# Altium footprint library PcbLib1.PcbLib: 150 footprints (part 1 of 10)
Each footprint in its own frame and in the unit in brackets; x right, y up, seen from the top. Pads: shape width x height; smd on the part's side, far side on the other; paste and mask are expansions set on the pad; w line width, h text height; cw(c..) or ccw(c..) is an arc to the next point about the centre after c.
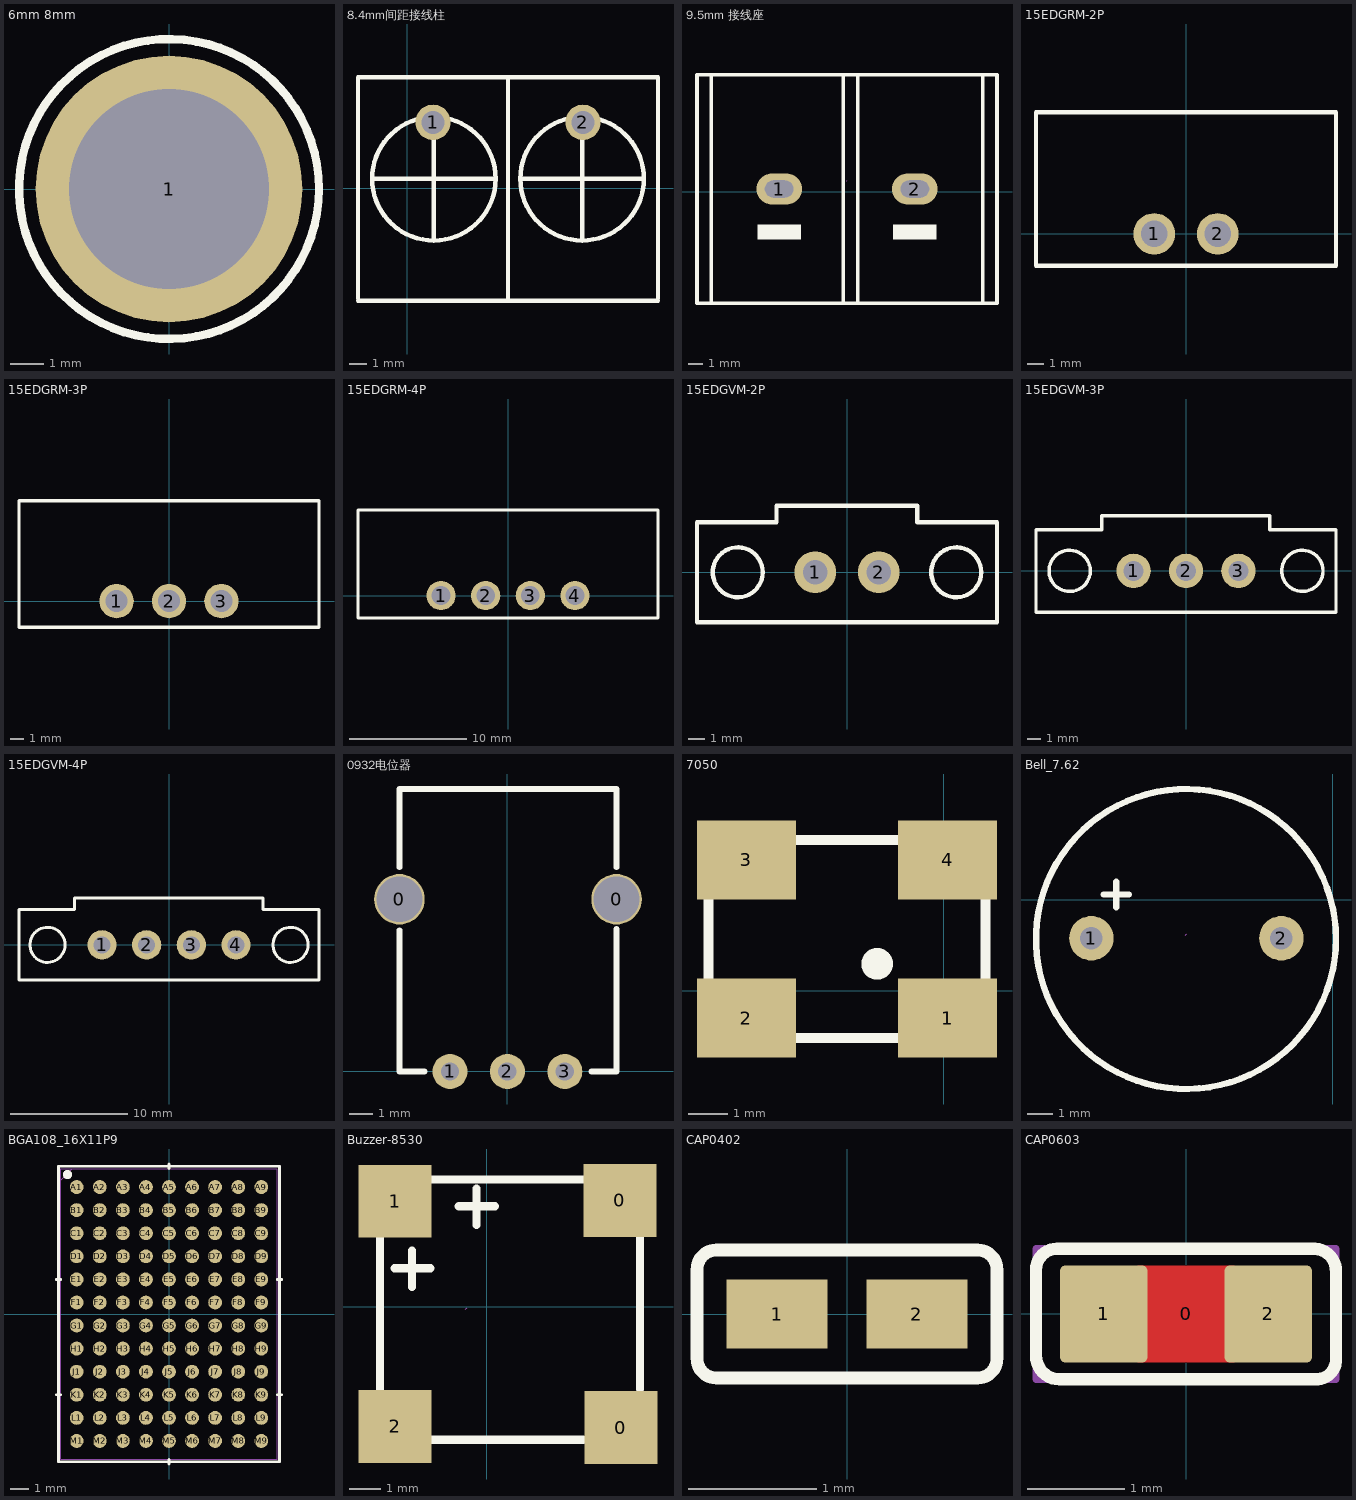
[diagram p0: the footprints below, top view; thin cyan lines are the x and y axes]

## 6mm 8mm [mm]
pads (1):
  round 8 hole 6: 1(0,0)
Top Overlay:
  circle w0.254: c0,0 r4.5

## 8.4mm间距接线柱 [mm]
pads (2):
  round 2 hole 1.3: 1(1.456,3.725) 2(9.956,3.725)
Top Overlay:
  circle w0.254: c1.506,0.525 r3.5
  circle w0.254: c9.904,0.525 r3.5
  lines w0.254: -2.794,-6.375 14.206,-6.375 ; -2.794,-6.275 -2.794,6.225 ; -2.794,6.265 14.206,6.265 ; -1.994,0.525 5.006,0.525 ; 1.506,-2.975 1.506,3.925 ; 5.706,-6.275 5.706,6.225 ; 6.404,0.526 13.404,0.526 ; 9.904,-2.974 9.904,3.926 ; 14.206,-6.275 14.206,6.225
Mechanical 15:
  lines w0.003: 5.681,0.522 5.731,0.573

## 9.5mm 接线座 [mm]
pads (2):
  oval 3.2x2.2 hole 1.2 slot 2 at 0 deg: 1(8.443,0.177) 2(17.942,0.177)
Top Overlay:
  region: 6.942,-2.323 9.942,-2.323 9.942,-3.323 6.942,-3.323
  region: 16.442,-2.323 19.442,-2.323 19.442,-3.323 16.442,-3.323
  lines w0.254: 3.693,-7.823 3.693,8.177 ; 12.943,-7.823 12.943,8.177 ; 13.943,-7.823 13.943,8.177 ; 22.692,-7.823 22.692,8.177 ; 23.692,-7.823 2.692,-7.823 2.693,8.177 23.692,8.177 ; 23.692,-7.823 23.692,8.177
Mechanical 15:
  lines w0.003: 13.167,0.734 13.218,0.785

## 15EDGRM-2P [mm]
pads (2):
  round 2.5 hole 1.6: 1(-1.905,0) 2(1.905,0)
Top Overlay:
  lines w0.254: -9,-1.905 -9,7.295 9,7.295 9,-1.905 -9,-1.905
3D body "2-4零件.STEP": height 7.9, standoff -2.6, extent -9,-1.143 9,8.057

## 15EDGRM-3P [mm]
pads (3):
  round 2.5 hole 1.6: 1(-3.81,0) 2(0,0) 3(3.81,0)
Top Overlay:
  lines w0.254: -10.905,-1.905 -10.905,7.295 10.905,7.295 10.905,-1.905 -10.905,-1.905
3D body "3-1零件.STEP": height 7.9, standoff -2.6, extent -10.725,-1.143 10.775,8.057

## 15EDGRM-4P [mm]
pads (4):
  round 2.5 hole 1.6: 1(-5.715,0) 2(-1.905,0) 3(1.905,0) 4(5.715,0)
Top Overlay:
  lines w0.254: -12.81,-1.905 12.81,-1.905 12.81,7.295 -12.81,7.295 -12.81,-1.905
3D body "4-2零件.STEP": height 7.9, standoff -2.6, extent -12.139,-1.27 12.241,7.93

## 15EDGVM-2P [mm]
pads (2):
  round 2.5 hole 1.45: 1(-1.905,0) 2(1.905,0)
Top Overlay:
  circle w0.254: c-6.555,0 r1.5
  circle w0.254: c6.555,0 r1.5
  lines w0.254: -9,-3 9,-3 9,3 ; -9,-2.997 -9,3 -4.235,3 ; -4.242,3 -4.235,3 ; 4.216,3 4.216,3.998 -4.235,3.998 -4.235,3 ; 4.235,3 8.985,3
3D body "2-1零件.STEP": height 21.64, standoff 2.54, extent -9.025,-4.623 8.975,4.877
3D body "2-2零件.STEP": height 9.2, standoff -3.5, extent -8.992,-2.885 9.008,4.115

## 15EDGVM-3P [mm]
pads (3):
  round 2.5 hole 1.45: 1(-3.81,0) 2(0,0) 3(3.81,0)
Top Overlay:
  circle w0.254: c-8.46,0 r1.5
  circle w0.254: c8.46,0 r1.5
  lines w0.254: 6.096,3 6.096,3.998 -6.121,3.998 -6.121,3 -10.905,3 -10.905,-3 10.905,-3 10.905,3 ; 6.121,2.997 10.871,2.997
3D body "3-3零件.STEP": height 21.64, standoff 2.54, extent -10.699,-4.953 10.801,4.547
3D body "3-2零件.STEP": height 9.2, standoff -3.5, extent -10.693,-3.063 10.807,3.937

## 15EDGVM-4P [mm]
pads (4):
  round 2.5 hole 1.45: 1(-5.715,0) 2(-1.905,0) 3(1.905,0) 4(5.715,0)
Top Overlay:
  circle w0.254: c10.365,0 r1.5
  circle w0.254: c-10.365,0 r1.5
  lines w0.254: -8.052,3 -8.045,3 ; 8.026,3 8.026,3.998 -8.045,3.998 -8.045,3 ; 8.045,3 12.795,3 12.795,-3 -12.795,-3 -12.795,3 -8.045,3
3D body "4-1零件.STEP": height 9.2, standoff -3.5, extent -12.063,-3.038 12.317,3.962
3D body "4-3零件.STEP": height 21.64, standoff 2.54, extent -12.086,-4.877 12.294,4.623

## 0932电位器 [mm]
pads (5):
  round 2.2 hole 2: 0(-4.7,7.5) 0(4.75,7.5)
  round 1.524 hole 0.8: 1(-2.5,0) 2(0,0) 3(2.5,0)
Top Overlay:
  lines w0.254: -4.7,6.147 -4.7,0 -3.607,0 ; -4.7,8.89 -4.7,12.3 4.75,12.3 4.75,8.89 ; 3.657,0 4.749,0 4.749,6.198

## 7050 [mm]
pads (4):
  rect 2.5x2 smd: 1(0.102,-0.686) 2(-4.978,-0.686) 3(-4.978,3.312) 4(0.102,3.312)
Top Overlay:
  lines w0.254: -5.938,-1.187 -5.938,3.813 1.062,3.813 1.062,-1.187 -5.938,-1.187
  lines w0.4: -1.678,0.886 ccw(c-1.676,0.686) -1.675,0.886

## Bell_7.62 [mil]
pads (2):
  round 70 hole 35.4: 1(-379.9,-60.6) 2(-80.7,-60.6)
Top Overlay:
  circle w10: c-230.8,-61.8 r236.2
  lines w10: -360.8,8.2 -320.8,8.2 ; -340.8,-11.8 -340.8,28.2
Mechanical 15:
  lines w0.1: -231.8,-55.85 -229.8,-53.85

## BGA108_16X11P9 [mil]
pads (108):
  round 30 smd paste+0 mask+0: A1(-200,275) A2(-150,275) A3(-100,275) A4(-50,275) A5(0,275) A6(50,275) A7(100,275) A8(150,275) A9(200,275) B1(-200,225) B2(-150,225) B3(-100,225) B4(-50,225) B5(0,225) B6(50,225) B7(100,225) B8(150,225) B9(200,225) C1(-200,175) C2(-150,175) C3(-100,175) C4(-50,175) C5(0,175) C6(50,175) C7(100,175) C8(150,175) C9(200,175) D1(-200,125) D2(-150,125) D3(-100,125) D4(-50,125) D5(0,125) D6(50,125) D7(100,125) D8(150,125) D9(200,125) E1(-200,75) E2(-150,75) E3(-100,75) E4(-50,75) E5(0,75) E6(50,75) E7(100,75) E8(150,75) E9(200,75) F1(-200,25) F2(-150,25) F3(-100,25) F4(-50,25) F5(0,25) F6(50,25) F7(100,25) F8(150,25) F9(200,25) G1(-200,-25) G2(-150,-25) G3(-100,-25) G4(-50,-25) G5(0,-25) G6(50,-25) G7(100,-25) G8(150,-25) G9(200,-25) H1(-200,-75) H2(-150,-75) H3(-100,-75) H4(-50,-75) H5(0,-75) H6(50,-75) H7(100,-75) H8(150,-75) H9(200,-75) J1(-200,-125) J2(-150,-125) J3(-100,-125) J4(-50,-125) J5(0,-125) J6(50,-125) J7(100,-125) J8(150,-125) J9(200,-125) K1(-200,-175) K2(-150,-175) K3(-100,-175) K4(-50,-175) K5(0,-175) K6(50,-175) K7(100,-175) K8(150,-175) K9(200,-175) L1(-200,-225) L2(-150,-225) L3(-100,-225) L4(-50,-225) L5(0,-225) L6(50,-225) L7(100,-225) L8(150,-225) L9(200,-225) M1(-200,-275) M2(-150,-275) M3(-100,-275) M4(-50,-275) M5(0,-275) M6(50,-275) M7(100,-275) M8(150,-275) M9(200,-275)
Top Overlay:
  circle w10: c-220,302 r5
  lines w6: -244.5,-175 -234.5,-175 ; -244.5,75 -234.5,75 ; 0,-325 0,-315 ; 0,315 0,325 ; 234.5,-175 244.5,-175 ; 234.5,75 244.5,75 ; -239.5,-320 -239.5,320 239.5,320 239.5,-320 -239.5,-320
Mechanical 13:
  lines w1: -234.5,290 -209.5,315 ; -234.5,-315 -234.5,315 234.5,315 234.5,-315 -234.5,-315
3D body "BGA108_16X11P9.step": height 146.1, standoff 0, extent -234.49,-315 234.49,315
3D body: height 10, standoff 0, extent 0,0 10,10

## Buzzer-8530 [mm]
pads (4):
  rect 2.3x2.3 smd: 0(4.194,3.358) 0(4.224,-3.803) 1(-2.895,3.332) 2(-2.897,-3.77)
Top Overlay:
  lines w0.254: -3.376,-2.588 -3.376,2.212 ; -2.921,1.219 -1.778,1.219 ; -2.362,0.635 -2.362,1.778 ; -1.776,-4.188 3.024,-4.188 ; -1.776,4.012 3.024,4.012 ; -0.889,3.175 0.254,3.175 ; -0.33,2.591 -0.33,3.734 ; 4.824,-2.588 4.824,2.212
Mechanical 15:
  lines w0.003: -0.678,-0.072 -0.628,-0.021
3D body "User Library-MLT-8530.STEP": height 3, standoff 0, extent -3.539,-4.351 4.961,4.149

## CAP0402 [mm]
pads (2):
  rect 0.79x0.54 smd: 1(-0.545,0) 2(0.545,0)
Top Overlay:
  lines w0.1: -1.169,-0.346 ccw(c-1.016,-0.346) -1.016,-0.499 -0.226,-0.499 0.226,-0.499 1.016,-0.499 ccw(c1.016,-0.346) 1.169,-0.346 1.169,0.346 ccw(c1.016,0.346) 1.016,0.499 0.226,0.499 -0.226,0.499 -1.016,0.499 ccw(c-1.016,0.346) -1.169,0.346 -1.169,-0.346
Mechanical 5:
  region: 0.5,-0.25 0.5,0.25 0.25,0.25 0.25,-0.25
3D body "0402_AVX.step": height 0.56, standoff 0, extent -0.559,-0.305 0.559,0.305

## CAP0603 [mm]
pads (3):
  round 0.254 on Mech14: 0(0,0)
  rrect10% 0.9x1 smd: 1(-0.85,0) 2(0.85,0)
Top Layer:
  pour cut-out: -0.5,0.5 0.5,0.5 0.5,-0.5 -0.5,-0.5
Top Overlay:
  lines w0.127: -1.55,-0.432 ccw(c-1.307,-0.432) -1.307,-0.675 -0.45,-0.675 0.45,-0.675 1.361,-0.675 ccw(c1.346,-0.472) 1.549,-0.457 1.549,0.432 ccw(c1.319,0.445) 1.332,0.675 0.45,0.675 -0.45,0.675 -1.332,0.675 ccw(c-1.332,0.457) -1.55,0.457 -1.55,-0.432
Mechanical 13:
  lines w0.05: -0.6,-0.4 -0.6,0.399 0.6,0.4 0.6,-0.4 -0.6,-0.399 ; -0.505,-0.398 -0.505,0.398 ; -0.5,-0.4 -0.8,-0.4 -0.8,0.4 -0.5,0.4 ; 0.5,-0.4 0.8,-0.4 0.8,0.4 0.5,0.4 ; 0.505,-0.398 0.505,0.398 ; -0.599,-0.398 -0.599,0.398 0.599,0.398 0.599,-0.398 -0.599,-0.398
Mechanical 14:
  lines w0.076: -1.55,-0.675 1.55,-0.675 1.55,0.675 -1.55,0.675 -1.55,-0.675
3D body "CAP_0603.STEP": height 0.89, standoff -0.01, extent -0.85,-0.45 0.85,0.45